# Altium schematic symbol library TTL_74系列.SchLib: 721 symbols (part 1 of 7) (continued)
## 74F182
designator U?
Look-Ahead Carry Generator
footprint DIP-16
simulation model 74F182 (SIMCODE)
pins: 1 ~{G}1 (in), 2 ~{P}1 (in), 3 ~{G}0 (in), 4 ~{P}0 (in), 5 ~{G}3 (in), 6 ~{P}3 (in), 7 ~{P} (out), 8 GND (power) hidden to GND, 9 Cn+z (out), 10 ~{G} (out), 11 Cn+y (out), 12 Cn+x (out), 13 Cn (in), 14 ~{G}2 (in), 15 ~{P}2 (in), 16 VCC (power) hidden to VCC
1 alternate drawing of the same symbol

## 74F190
designator U?
Synchronous 4-Bit Up/Down Decade Counter with Down/Up Mode Control
footprint DIP-16
simulation model 74F190 (SIMCODE)
pins: 1 B (in), 2 QB (out), 3 QA (out), 4 ~{CTEN} (in), 5 D/~{U} (in), 6 QC (out), 7 QD (out), 8 GND (power) hidden to GND, 9 D (in), 10 C (in), 11 ~{LD} (in), 12 MAX/MIN (out), 13 ~{RCO} (out), 14 CLK (in), 15 A (in), 16 VCC (power) hidden to VCC
1 alternate drawing of the same symbol

## 74F191
designator U?
Synchronous 4-Bit Up/Down Binary Counter with Down/Up Mode Control
footprint DIP-16
simulation model 74F191 (SIMCODE)
pins: 1 B (in), 2 QB (out), 3 QA (out), 4 ~{CTEN} (in), 5 D/~{U} (in), 6 QC (out), 7 QD (out), 8 GND (power) hidden to GND, 9 D (in), 10 C (in), 11 ~{LD} (in), 12 MAX/MIN (out), 13 ~{RCO} (out), 14 CLK (in), 15 A (in), 16 VCC (power) hidden to VCC
1 alternate drawing of the same symbol

## 74F192
designator U?
Synchronous 4-Bit Up/Down Decade Counter (Dual Clock with Clear)
footprint DIP-16
simulation model 74F192 (SIMCODE)
pins: 1 B (in), 2 QB (out), 3 QA (out), 4 DWN (in), 5 UP (in), 6 QC (out), 7 QD (out), 8 GND (power) hidden to GND, 9 D (in), 10 C (in), 11 ~{LD} (in), 12 ~{CO} (out), 13 ~{BO} (out), 14 CLR (in), 15 A (in), 16 VCC (power) hidden to VCC
1 alternate drawing of the same symbol

## 74F193
designator U?
Synchronous 4-Bit Up/Down Binary Counter (Dual Clock with Clear)
footprint DIP-16
simulation model 74F193 (SIMCODE)
pins: 1 B (in), 2 QB (out), 3 QA (out), 4 DWN (in), 5 UP (in), 6 QC (out), 7 QD (out), 8 GND (power) hidden to GND, 9 D (in), 10 C (in), 11 ~{LD} (in), 12 ~{CO} (out), 13 ~{BO} (out), 14 CLR (in), 15 A (in), 16 VCC (power) hidden to VCC
1 alternate drawing of the same symbol

## 74F194
designator U?
4-Bit Bidirectional Universal Shift Register
footprint DIP-16
simulation model 74F194 (SIMCODE)
pins: 1 ~{CLR} (in), 2 SR SER (in), 3 A (in), 4 B (in), 5 C (in), 6 D (in), 7 SL SER (in), 8 GND (power) hidden to GND, 9 S0 (in), 10 S1 (in), 11 CLK (in), 12 QD (out), 13 QC (out), 14 QB (out), 15 QA (out), 16 VCC (power) hidden to VCC
1 alternate drawing of the same symbol

## 74F195
designator U?
4-Bit Parallel-Access Shift Register
footprint DIP-16
simulation model 74F195 (SIMCODE)
pins: 1 ~{CLR} (in), 2 J (in), 3 ~{K} (in), 4 A (in), 5 B (in), 6 C (in), 7 D (in), 8 GND (power) hidden to GND, 9 SH/~{LD} (in), 10 CLK (in), 11 ~{Q}D (out), 12 QD (out), 13 QC (out), 14 QB (out), 15 QA (out), 16 VCC (power) hidden to VCC
1 alternate drawing of the same symbol

## 74F199
designator U?
8-Bit Shift Register
footprint DIP-24
simulation model 74F199 (SIMCODE)
pins: 1 ~{K} (in), 2 J (in), 3 A (in), 4 QA (out), 5 B (in), 6 QB (out), 7 C (in), 8 QC (out), 9 D (in), 10 QD (out), 11 CK INH (in), 12 GND (power) hidden to GND, 13 CLK (in), 14 ~{CLR} (in), 15 QE (out), 16 E (in), 17 QF (out), 18 F (in), 19 QG (out), 20 G (in), 21 QH (out), 22 H (in), 23 SH/~{LD} (in), 24 VCC (power) hidden to VCC
1 alternate drawing of the same symbol

## 74F240
designator U?
Octal Buffer and Line Driver with 3-State Output
footprint DIP-20
simulation model 74F240 (SIMCODE)
pins: 1 1~{G} (in), 2 A1 (in), 3 2Y4 (hiz), 4 A2 (in), 5 2Y3 (hiz), 6 A3 (in), 7 2Y2 (hiz), 8 A4 (in), 9 2Y1 (hiz), 10 GND (power) hidden to GND, 11 B1 (in), 12 1Y4 (hiz), 13 B2 (in), 14 1Y3 (hiz), 15 B3 (in), 16 1Y2 (hiz), 17 B4 (in), 18 1Y1 (hiz), 19 2~{G} (in), 20 VCC (power) hidden to VCC
1 alternate drawing of the same symbol

## 74F241
designator U?
Octal Buffer and Line Driver with 3-State Output
footprint DIP-20
simulation model 74F241 (SIMCODE)
pins: 1 1~{G} (in), 2 A1 (in), 3 2Y4 (hiz), 4 A2 (in), 5 2Y3 (hiz), 6 A3 (in), 7 2Y2 (hiz), 8 A4 (in), 9 2Y1 (hiz), 10 GND (power) hidden to GND, 11 B1 (in), 12 1Y4 (hiz), 13 B2 (in), 14 1Y3 (hiz), 15 B3 (in), 16 1Y2 (hiz), 17 B4 (in), 18 1Y1 (hiz), 19 2~{G} (in), 20 VCC (power) hidden to VCC
1 alternate drawing of the same symbol

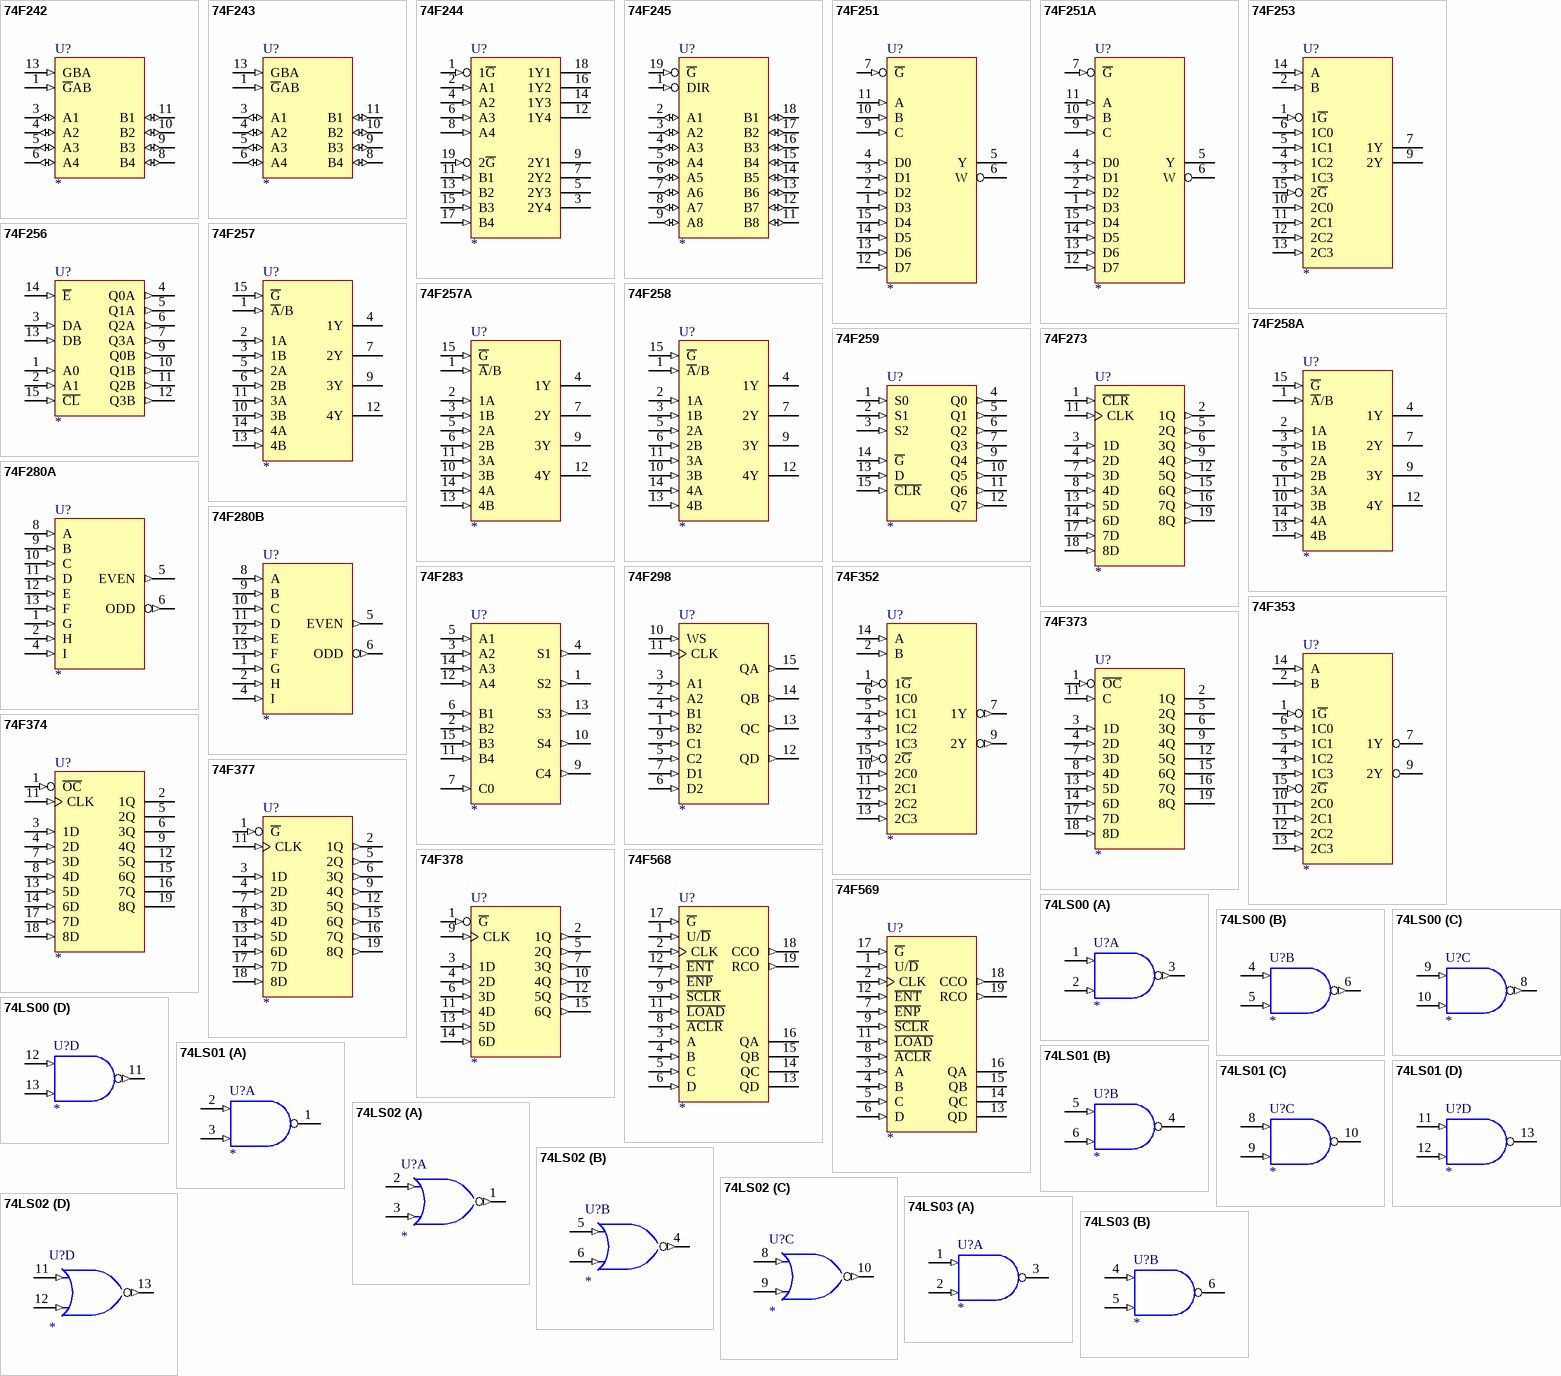
[diagram p3: symbols 74F242 to 74LS03]

## 74F242
designator U?
Quad Bus Transceiver
footprint DIP-14
simulation model 74F242 (SIMCODE)
pins: 1 ~{G}AB (in), 3 A1 (io), 4 A2 (io), 5 A3 (io), 6 A4 (io), 7 GND (power) hidden to GND, 8 B4 (io), 9 B3 (io), 10 B2 (io), 11 B1 (io), 13 GBA (in), 14 VCC (power) hidden to VCC
1 alternate drawing of the same symbol

## 74F243
designator U?
Quad Bus Transceiver
footprint DIP-14
simulation model 74F243 (SIMCODE)
pins: 1 ~{G}AB (in), 3 A1 (io), 4 A2 (io), 5 A3 (io), 6 A4 (io), 7 GND (power) hidden to GND, 8 B4 (io), 9 B3 (io), 10 B2 (io), 11 B1 (io), 13 GBA (in), 14 VCC (power) hidden to VCC
1 alternate drawing of the same symbol

## 74F244
designator U?
Octal Buffer and Line Driver with 3-State Output
footprint DIP-20
simulation model 74F244 (SIMCODE)
pins: 1 1~{G} (in), 2 A1 (in), 3 2Y4 (hiz), 4 A2 (in), 5 2Y3 (hiz), 6 A3 (in), 7 2Y2 (hiz), 8 A4 (in), 9 2Y1 (hiz), 10 GND (power) hidden to GND, 11 B1 (in), 12 1Y4 (hiz), 13 B2 (in), 14 1Y3 (hiz), 15 B3 (in), 16 1Y2 (hiz), 17 B4 (in), 18 1Y1 (hiz), 19 2~{G} (in), 20 VCC (power) hidden to VCC
1 alternate drawing of the same symbol

## 74F245
designator U?
Octal Bus Transceiver with 3-State Output
footprint DIP-20
simulation model 74F245 (SIMCODE)
pins: 1 DIR (in), 2 A1 (io), 3 A2 (io), 4 A3 (io), 5 A4 (io), 6 A5 (io), 7 A6 (io), 8 A7 (io), 9 A8 (io), 10 GND (power) hidden to GND, 11 B8 (io), 12 B7 (io), 13 B6 (io), 14 B5 (io), 15 B4 (io), 16 B3 (io), 17 B2 (io), 18 B1 (io), 19 ~{G} (in), 20 VCC (power) hidden to VCC
1 alternate drawing of the same symbol

## 74F251
designator U?
1-of-8 Data Selectors/Multiplexers with 3-State Output
footprint DIP-16
simulation model 74F251 (SIMCODE)
pins: 1 D3 (in), 2 D2 (in), 3 D1 (in), 4 D0 (in), 5 Y (hiz), 6 W (hiz), 7 ~{G} (in), 8 GND (power) hidden to GND, 9 C (in), 10 B (in), 11 A (in), 12 D7 (in), 13 D6 (in), 14 D5 (in), 15 D4 (in), 16 VCC (power) hidden to VCC
1 alternate drawing of the same symbol

## 74F251A
designator U?
1-of-8 Data Selectors/Multiplexers with 3-State Output
footprint DIP-16
simulation model 74F251A (SIMCODE)
pins: 1 D3 (in), 2 D2 (in), 3 D1 (in), 4 D0 (in), 5 Y (hiz), 6 W (hiz), 7 ~{G} (in), 8 GND (power) hidden to GND, 9 C (in), 10 B (in), 11 A (in), 12 D7 (in), 13 D6 (in), 14 D5 (in), 15 D4 (in), 16 VCC (power) hidden to VCC
1 alternate drawing of the same symbol

## 74F253
designator U?
Dual 4-Line to 1-Line Data Selector/Multiplexer with 3-State Output
footprint DIP-16
simulation model 74F253 (SIMCODE)
pins: 1 1~{G} (in), 2 B (in), 3 1C3 (in), 4 1C2 (in), 5 1C1 (in), 6 1C0 (in), 7 1Y (hiz), 8 GND (power) hidden to GND, 9 2Y (hiz), 10 2C0 (in), 11 2C1 (in), 12 2C2 (in), 13 2C3 (in), 14 A (in), 15 2~{G} (in), 16 VCC (power) hidden to VCC
1 alternate drawing of the same symbol

## 74F256
designator U?
Dual 4-Bit Addressable Latch
footprint DIP-16
simulation model 74F256 (SIMCODE)
pins: 1 A0 (in), 2 A1 (in), 3 DA (in), 4 Q0A (out), 5 Q1A (out), 6 Q2A (out), 7 Q3A (out), 8 GND (power) hidden to GND, 9 Q0B (out), 10 Q1B (out), 11 Q2B (out), 12 Q3B (out), 13 DB (in), 14 ~{E} (in), 15 ~{CL} (in), 16 VCC (power) hidden to VCC

## 74F257
designator U?
Quad 2-Line to 1-Line Data/Selector/Multiplexer with 3-State Output
footprint DIP-16
simulation model 74F257 (SIMCODE)
pins: 1 ~{A}/B (in), 2 1A (in), 3 1B (in), 4 1Y (hiz), 5 2A (in), 6 2B (in), 7 2Y (hiz), 8 GND (power) hidden to GND, 9 3Y (hiz), 10 3B (in), 11 3A (in), 12 4Y (hiz), 13 4B (in), 14 4A (in), 15 ~{G} (in), 16 VCC (power) hidden to VCC
1 alternate drawing of the same symbol

## 74F257A
designator U?
Quad 2-Line to 1-Line Data/Selector/Multiplexer with 3-State Output
footprint DIP-16
simulation model 74F257A (SIMCODE)
pins: 1 ~{A}/B (in), 2 1A (in), 3 1B (in), 4 1Y (hiz), 5 2A (in), 6 2B (in), 7 2Y (hiz), 8 GND (power) hidden to GND, 9 3Y (hiz), 10 3B (in), 11 3A (in), 12 4Y (hiz), 13 4B (in), 14 4A (in), 15 ~{G} (in), 16 VCC (power) hidden to VCC
1 alternate drawing of the same symbol

## 74F258
designator U?
Quad 2-Line to 1-Line Data/Selector/Multiplexer with 3-State Output
footprint DIP-16
simulation model 74F258 (SIMCODE)
pins: 1 ~{A}/B (in), 2 1A (in), 3 1B (in), 4 1Y (hiz), 5 2A (in), 6 2B (in), 7 2Y (hiz), 8 GND (power) hidden to GND, 9 3Y (hiz), 10 3B (in), 11 3A (in), 12 4Y (hiz), 13 4B (in), 14 4A (in), 15 ~{G} (in), 16 VCC (power) hidden to VCC
1 alternate drawing of the same symbol

## 74F258A
designator U?
Quad 2-Line to 1-Line Data/Selector/Multiplexer with 3-State Output
footprint DIP-16
simulation model 74F258A (SIMCODE)
pins: 1 ~{A}/B (in), 2 1A (in), 3 1B (in), 4 1Y (hiz), 5 2A (in), 6 2B (in), 7 2Y (hiz), 8 GND (power) hidden to GND, 9 3Y (hiz), 10 3B (in), 11 3A (in), 12 4Y (hiz), 13 4B (in), 14 4A (in), 15 ~{G} (in), 16 VCC (power) hidden to VCC
1 alternate drawing of the same symbol

## 74F259
designator U?
8-Bit Addressable Latch
footprint DIP-16
simulation model 74F259 (SIMCODE)
pins: 1 S0 (in), 2 S1 (in), 3 S2 (in), 4 Q0 (out), 5 Q1 (out), 6 Q2 (out), 7 Q3 (out), 8 GND (power) hidden to GND, 9 Q4 (out), 10 Q5 (out), 11 Q6 (out), 12 Q7 (out), 13 D (in), 14 ~{G} (in), 15 ~{CLR} (in), 16 VCC (power) hidden to VCC
1 alternate drawing of the same symbol

## 74F273
designator U?
Octal D-Type Flip-Flop with Clear
footprint DIP-20
simulation model 74F273 (SIMCODE)
pins: 1 ~{CLR} (in), 2 1Q (out), 3 1D (in), 4 2D (in), 5 2Q (out), 6 3Q (out), 7 3D (in), 8 4D (in), 9 4Q (out), 10 GND (power) hidden to GND, 11 CLK (in), 12 5Q (out), 13 5D (in), 14 6D (in), 15 6Q (out), 16 7Q (out), 17 7D (in), 18 8D (in), 19 8Q (out), 20 VCC (power) hidden to VCC
1 alternate drawing of the same symbol

## 74F280A
designator U?
9-Bit Odd/Even Parity Generator/Checker
footprint DIP-14
simulation model 74F280A (SIMCODE)
pins: 1 G (in), 2 H (in), 4 I (in), 5 EVEN (out), 6 ODD (out), 7 GND (power) hidden to GND, 8 A (in), 9 B (in), 10 C (in), 11 D (in), 12 E (in), 13 F (in), 14 VCC (power) hidden to VCC
1 alternate drawing of the same symbol

## 74F280B
designator U?
9-Bit Odd/Even Parity Generator/Checker
footprint DIP-14
simulation model 74F280B (SIMCODE)
pins: 1 G (in), 2 H (in), 4 I (in), 5 EVEN (out), 6 ODD (out), 7 GND (power) hidden to GND, 8 A (in), 9 B (in), 10 C (in), 11 D (in), 12 E (in), 13 F (in), 14 VCC (power) hidden to VCC
1 alternate drawing of the same symbol

## 74F283
designator U?
4-Bit Binary Full Adder with Fast Carry
footprint DIP-16
simulation model 74F283 (SIMCODE)
pins: 1 S2 (out), 2 B2 (in), 3 A2 (in), 4 S1 (out), 5 A1 (in), 6 B1 (in), 7 C0 (in), 8 GND (power) hidden to GND, 9 C4 (out), 10 S4 (out), 11 B4 (in), 12 A4 (in), 13 S3 (out), 14 A3 (in), 15 B3 (in), 16 VCC (power) hidden to VCC
1 alternate drawing of the same symbol

## 74F298
designator U?
Quad 2-Input Multiplexer with Storage
footprint DIP-16
simulation model 74F298 (SIMCODE)
pins: 1 B2 (in), 2 A2 (in), 3 A1 (in), 4 B1 (in), 5 C2 (in), 6 D2 (in), 7 D1 (in), 8 GND (power) hidden to GND, 9 C1 (in), 10 WS (in), 11 CLK (in), 12 QD (out), 13 QC (out), 14 QB (out), 15 QA (out), 16 VCC (power) hidden to VCC
1 alternate drawing of the same symbol

## 74F352
designator U?
Dual 4-Line to 1-Line Data Selector/Multiplexer
footprint DIP-16
simulation model 74F352 (SIMCODE)
pins: 1 1~{G} (in), 2 B (in), 3 1C3 (in), 4 1C2 (in), 5 1C1 (in), 6 1C0 (in), 7 1Y (out), 8 GND (power) hidden to GND, 9 2Y (out), 10 2C0 (in), 11 2C1 (in), 12 2C2 (in), 13 2C3 (in), 14 A (in), 15 2~{G} (in), 16 VCC (power) hidden to VCC
1 alternate drawing of the same symbol

## 74F353
designator U?
Dual 4-Line to 1-Line Data Selector/Multiplexer with 3-State Output
footprint DIP-16
simulation model 74F353 (SIMCODE)
pins: 1 1~{G} (in), 2 B (in), 3 1C3 (in), 4 1C2 (in), 5 1C1 (in), 6 1C0 (in), 7 1Y (hiz), 8 GND (power) hidden to GND, 9 2Y (hiz), 10 2C0 (in), 11 2C1 (in), 12 2C2 (in), 13 2C3 (in), 14 A (in), 15 2~{G} (in), 16 VCC (power) hidden to VCC
1 alternate drawing of the same symbol

## 74F373
designator U?
Octal D-Type Transparent Latch with 3-State Output
footprint DIP-20
simulation model 74F373 (SIMCODE)
pins: 1 ~{OC} (in), 2 1Q (hiz), 3 1D (in), 4 2D (in), 5 2Q (hiz), 6 3Q (hiz), 7 3D (in), 8 4D (in), 9 4Q (hiz), 10 GND (power) hidden to GND, 11 C (in), 12 5Q (hiz), 13 5D (in), 14 6D (in), 15 6Q (hiz), 16 7Q (hiz), 17 7D (in), 18 8D (in), 19 8Q (hiz), 20 VCC (power) hidden to VCC
1 alternate drawing of the same symbol

## 74F374
designator U?
Octal D-Type Edge-Triggered Flip-Flop with 3-State Output
footprint DIP-20
simulation model 74F374 (SIMCODE)
pins: 1 ~{OC} (in), 2 1Q (hiz), 3 1D (in), 4 2D (in), 5 2Q (hiz), 6 3Q (hiz), 7 3D (in), 8 4D (in), 9 4Q (hiz), 10 GND (power) hidden to GND, 11 CLK (in), 12 5Q (hiz), 13 5D (in), 14 6D (in), 15 6Q (hiz), 16 7Q (hiz), 17 7D (in), 18 8D (in), 19 8Q (hiz), 20 VCC (power) hidden to VCC
1 alternate drawing of the same symbol

## 74F377
designator U?
Octal D-Type Flip-Flop with Enable
footprint DIP-20
simulation model 74F377 (SIMCODE)
pins: 1 ~{G} (in), 2 1Q (out), 3 1D (in), 4 2D (in), 5 2Q (out), 6 3Q (out), 7 3D (in), 8 4D (in), 9 4Q (out), 10 GND (power) hidden to GND, 11 CLK (in), 12 5Q (out), 13 5D (in), 14 6D (in), 15 6Q (out), 16 7Q (out), 17 7D (in), 18 8D (in), 19 8Q (out), 20 VCC (power) hidden to VCC
1 alternate drawing of the same symbol

## 74F378
designator U?
Hex D-Type Flip Flop with Enable
footprint DIP-16
simulation model 74F378 (SIMCODE)
pins: 1 ~{G} (in), 2 1Q (out), 3 1D (in), 4 2D (in), 5 2Q (out), 6 3D (in), 7 3Q (out), 8 GND (power) hidden to GND, 9 CLK (in), 10 4Q (out), 11 4D (in), 12 5Q (out), 13 5D (in), 14 6D (in), 15 6Q (out), 16 VCC (power) hidden to VCC
1 alternate drawing of the same symbol

## 74F568
designator U?
Synchronous 4-Bit Up/Down Decade Counter with 3-State Outputs
footprint DIP-20
simulation model 74F568 (SIMCODE)
pins: 1 U/~{D} (in), 2 CLK (in), 3 A (in), 4 B (in), 5 C (in), 6 D (in), 7 ~{ENP} (in), 8 ~{ACLR} (in), 9 ~{SCLR} (in), 10 GND (power) hidden to GND, 11 ~{LOAD} (in), 12 ~{ENT} (in), 13 QD (hiz), 14 QC (hiz), 15 QB (hiz), 16 QA (hiz), 17 ~{G} (in), 18 CCO (out), 19 RCO (out), 20 VCC (power) hidden to VCC
1 alternate drawing of the same symbol

## 74F569
designator U?
Synchronous 4-Bit Up/Down Binary Counter with 3-State Outputs
footprint DIP-20
simulation model 74F569 (SIMCODE)
pins: 1 U/~{D} (in), 2 CLK (in), 3 A (in), 4 B (in), 5 C (in), 6 D (in), 7 ~{ENP} (in), 8 ~{ACLR} (in), 9 ~{SCLR} (in), 10 GND (power) hidden to GND, 11 ~{LOAD} (in), 12 ~{ENT} (in), 13 QD (hiz), 14 QC (hiz), 15 QB (hiz), 16 QA (hiz), 17 ~{G} (in), 18 CCO (out), 19 RCO (out), 20 VCC (power) hidden to VCC
1 alternate drawing of the same symbol

## 74LS00
designator U?
Quad 2-Input Positive-NAND Gate
footprint DIP-14
simulation model 74LS00 (SIMCODE)
part A pins: 1 A (in), 2 B (in), 3 Y (out), 7 GND (power) hidden to GND, 14 VCC (power) hidden to VCC
part B pins: 4 A (in), 5 B (in), 6 Y (out), 7 GND (power) hidden to GND, 14 VCC (power) hidden to VCC
part C pins: 7 GND (power) hidden to GND, 8 Y (out), 9 A (in), 10 B (in), 14 VCC (power) hidden to VCC
part D pins: 7 GND (power) hidden to GND, 11 Y (out), 12 A (in), 13 B (in), 14 VCC (power) hidden to VCC
1 alternate drawing of the same symbol

## 74LS01
designator U?
Quad 2-Input Positive-NAND Gate with Open-Collector Output
footprint DIP-14
simulation model 74LS01 (SIMCODE)
part A pins: 1 Y (oc), 2 A (in), 3 B (in), 7 GND (power) hidden to GND, 14 VCC (power) hidden to VCC
part B pins: 4 Y (oc), 5 A (in), 6 B (in), 7 GND (power) hidden to GND, 14 VCC (power) hidden to VCC
part C pins: 7 GND (power) hidden to GND, 8 A (in), 9 B (in), 10 Y (oc), 14 VCC (power) hidden to VCC
part D pins: 7 GND (power) hidden to GND, 11 A (in), 12 B (in), 13 Y (oc), 14 VCC (power) hidden to VCC
1 alternate drawing of the same symbol

## 74LS02
designator U?
Quad 2-Input NOR Gate
footprint DIP-14
simulation model 74LS02 (SIMCODE)
part A pins: 1 Y (out), 2 A (in), 3 B (in), 7 GND (power) hidden to GND, 14 VCC (power) hidden to VCC
part B pins: 4 Y (out), 5 A (in), 6 B (in), 7 GND (power) hidden to GND, 14 VCC (power) hidden to VCC
part C pins: 7 GND (power) hidden to GND, 8 A (in), 9 B (in), 10 Y (out), 14 VCC (power) hidden to VCC
part D pins: 7 GND (power) hidden to GND, 11 A (in), 12 B (in), 13 Y (out), 14 VCC (power) hidden to VCC
1 alternate drawing of the same symbol

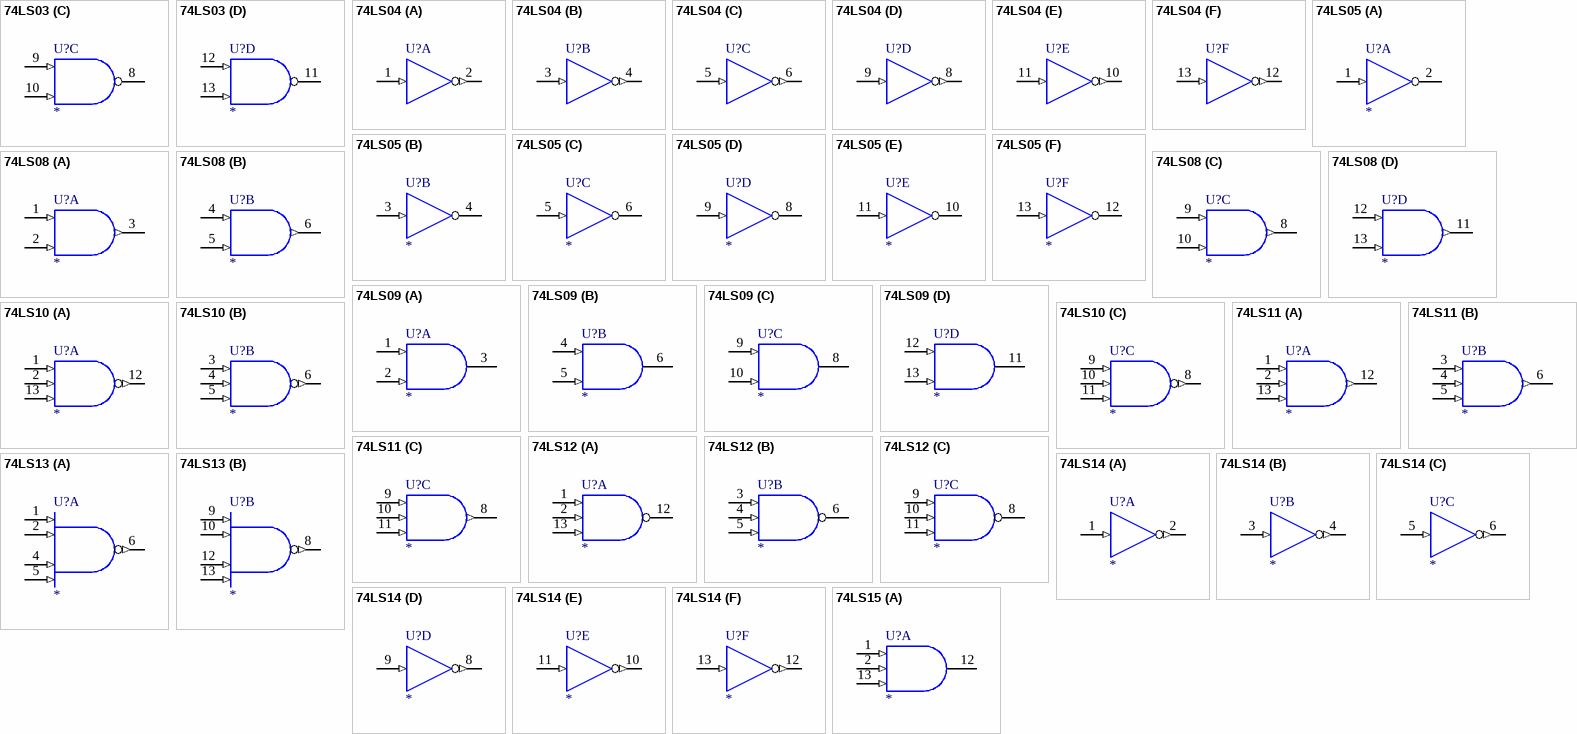
[diagram p4: symbols 74LS03 to 74LS15]

## 74LS03
designator U?
Quad 2-Input Positive-NAND Gate with Open-Collector Output
footprint DIP-14
simulation model 74LS03 (SIMCODE)
part A pins: 1 A (in), 2 B (in), 3 Y (oc), 7 GND (power) hidden to GND, 14 VCC (power) hidden to VCC
part B pins: 4 A (in), 5 B (in), 6 Y (oc), 7 GND (power) hidden to GND, 14 VCC (power) hidden to VCC
part C pins: 7 GND (power) hidden to GND, 8 Y (oc), 9 A (in), 10 B (in), 14 VCC (power) hidden to VCC
part D pins: 7 GND (power) hidden to GND, 11 Y (oc), 12 A (in), 13 B (in), 14 VCC (power) hidden to VCC
1 alternate drawing of the same symbol

## 74LS04
designator U?  (value not drawn)
Hex Inverter
footprint DIP-14
simulation model 74LS04 (SIMCODE)
footprint SOP-14
part A pins: 1 A (in), 2 Y (out), 7 GND (power) hidden to GND, 14 VCC (power) hidden to VCC
part B pins: 3 A (in), 4 Y (out), 7 GND (power) hidden to GND, 14 VCC (power) hidden to VCC
part C pins: 5 A (in), 6 Y (out), 7 GND (power) hidden to GND, 14 VCC (power) hidden to VCC
part D pins: 7 GND (power) hidden to GND, 8 Y (out), 9 A (in), 14 VCC (power) hidden to VCC
part E pins: 7 GND (power) hidden to GND, 10 Y (out), 11 A (in), 14 VCC (power) hidden to VCC
part F pins: 7 GND (power) hidden to GND, 12 Y (out), 13 A (in), 14 VCC (power) hidden to VCC
1 alternate drawing of the same symbol

## 74LS05
designator U?
Hex Inverter with Open-Collector Output
footprint DIP-14
simulation model 74LS05 (SIMCODE)
part A pins: 1 A (in), 2 Y (oc), 7 GND (power) hidden to GND, 14 VCC (power) hidden to VCC
part B pins: 3 A (in), 4 Y (oc), 7 GND (power) hidden to GND, 14 VCC (power) hidden to VCC
part C pins: 5 A (in), 6 Y (oc), 7 GND (power) hidden to GND, 14 VCC (power) hidden to VCC
part D pins: 7 GND (power) hidden to GND, 8 Y (oc), 9 A (in), 14 VCC (power) hidden to VCC
part E pins: 7 GND (power) hidden to GND, 10 Y (oc), 11 A (in), 14 VCC (power) hidden to VCC
part F pins: 7 GND (power) hidden to GND, 12 Y (oc), 13 A (in), 14 VCC (power) hidden to VCC
2 alternate drawings of the same symbol

## 74LS08
designator U?
Quad 2-Input Positive-AND Gate
footprint DIP-14
simulation model 74LS08 (SIMCODE)
part A pins: 1 A (in), 2 B (in), 3 Y (out), 7 GND (power) hidden to GND, 14 VCC (power) hidden to VCC
part B pins: 4 A (in), 5 B (in), 6 Y (out), 7 GND (power) hidden to GND, 14 VCC (power) hidden to VCC
part C pins: 7 GND (power) hidden to GND, 8 Y (out), 9 A (in), 10 B (in), 14 VCC (power) hidden to VCC
part D pins: 7 GND (power) hidden to GND, 11 Y (out), 12 A (in), 13 B (in), 14 VCC (power) hidden to VCC
1 alternate drawing of the same symbol

## 74LS09
designator U?
Quad 2-Input Positive-AND Gate with Open-Collector Output
footprint DIP-14
simulation model 74LS09 (SIMCODE)
part A pins: 1 A (in), 2 B (in), 3 Y (oc), 7 GND (power) hidden to GND, 14 VCC (power) hidden to VCC
part B pins: 4 A (in), 5 B (in), 6 Y (oc), 7 GND (power) hidden to GND, 14 VCC (power) hidden to VCC
part C pins: 7 GND (power) hidden to GND, 8 Y (oc), 9 A (in), 10 B (in), 14 VCC (power) hidden to VCC
part D pins: 7 GND (power) hidden to GND, 11 Y (oc), 12 A (in), 13 B (in), 14 VCC (power) hidden to VCC
1 alternate drawing of the same symbol

## 74LS10
designator U?
Triple 3-Input Positive-NAND Gate
footprint DIP-14
simulation model 74LS10 (SIMCODE)
part A pins: 1 A (in), 2 B (in), 7 GND (power) hidden to GND, 12 Y (out), 13 C (in), 14 VCC (power) hidden to VCC
part B pins: 3 A (in), 4 B (in), 5 C (in), 6 Y (out), 7 GND (power) hidden to GND, 14 VCC (power) hidden to VCC
part C pins: 7 GND (power) hidden to GND, 8 Y (out), 9 A (in), 10 B (in), 11 C (in), 14 VCC (power) hidden to VCC
1 alternate drawing of the same symbol

## 74LS11
designator U?
Triple 3-Input Positive-AND Gate
footprint DIP-14
simulation model 74LS11 (SIMCODE)
part A pins: 1 A (in), 2 B (in), 7 GND (power) hidden to GND, 12 Y (out), 13 C (in), 14 VCC (power) hidden to VCC
part B pins: 3 A (in), 4 B (in), 5 C (in), 6 Y (out), 7 GND (power) hidden to GND, 14 VCC (power) hidden to VCC
part C pins: 7 GND (power) hidden to GND, 8 Y (out), 9 A (in), 10 B (in), 11 C (in), 14 VCC (power) hidden to VCC
1 alternate drawing of the same symbol

## 74LS12
designator U?
Triple 3-Input Positive-NAND Gate with Open-Collector Output
footprint DIP-14
simulation model 74LS12 (SIMCODE)
part A pins: 1 A (in), 2 B (in), 7 GND (power) hidden to GND, 12 Y (oc), 13 C (in), 14 VCC (power) hidden to VCC
part B pins: 3 A (in), 4 B (in), 5 C (in), 6 Y (oc), 7 GND (power) hidden to GND, 14 VCC (power) hidden to VCC
part C pins: 7 GND (power) hidden to GND, 8 Y (oc), 9 A (in), 10 B (in), 11 C (in), 14 VCC (power) hidden to VCC
1 alternate drawing of the same symbol

## 74LS13
designator U?
Dual 4-Input Positive-NAND Schmitt-Trigger
footprint DIP-14
simulation model 74LS13 (SIMCODE)
part A pins: 1 A (in), 2 B (in), 4 C (in), 5 D (in), 6 Y (out), 7 GND (power) hidden to GND, 14 VCC (power) hidden to VCC
part B pins: 7 GND (power) hidden to GND, 8 Y (out), 9 A (in), 10 B (in), 12 C (in), 13 D (in), 14 VCC (power) hidden to VCC
1 alternate drawing of the same symbol

## 74LS14
designator U?
Hex Schmitt-Trigger Inverter
footprint DIP-14
simulation model 74LS14 (SIMCODE)
part A pins: 1 A (in), 2 Y (out), 7 GND (power) hidden to GND, 14 VCC (power) hidden to VCC
part B pins: 3 A (in), 4 Y (out), 7 GND (power) hidden to GND, 14 VCC (power) hidden to VCC
part C pins: 5 A (in), 6 Y (out), 7 GND (power) hidden to GND, 14 VCC (power) hidden to VCC
part D pins: 7 GND (power) hidden to GND, 8 Y (out), 9 A (in), 14 VCC (power) hidden to VCC
part E pins: 7 GND (power) hidden to GND, 10 Y (out), 11 A (in), 14 VCC (power) hidden to VCC
part F pins: 7 GND (power) hidden to GND, 12 Y (out), 13 A (in), 14 VCC (power) hidden to VCC
1 alternate drawing of the same symbol

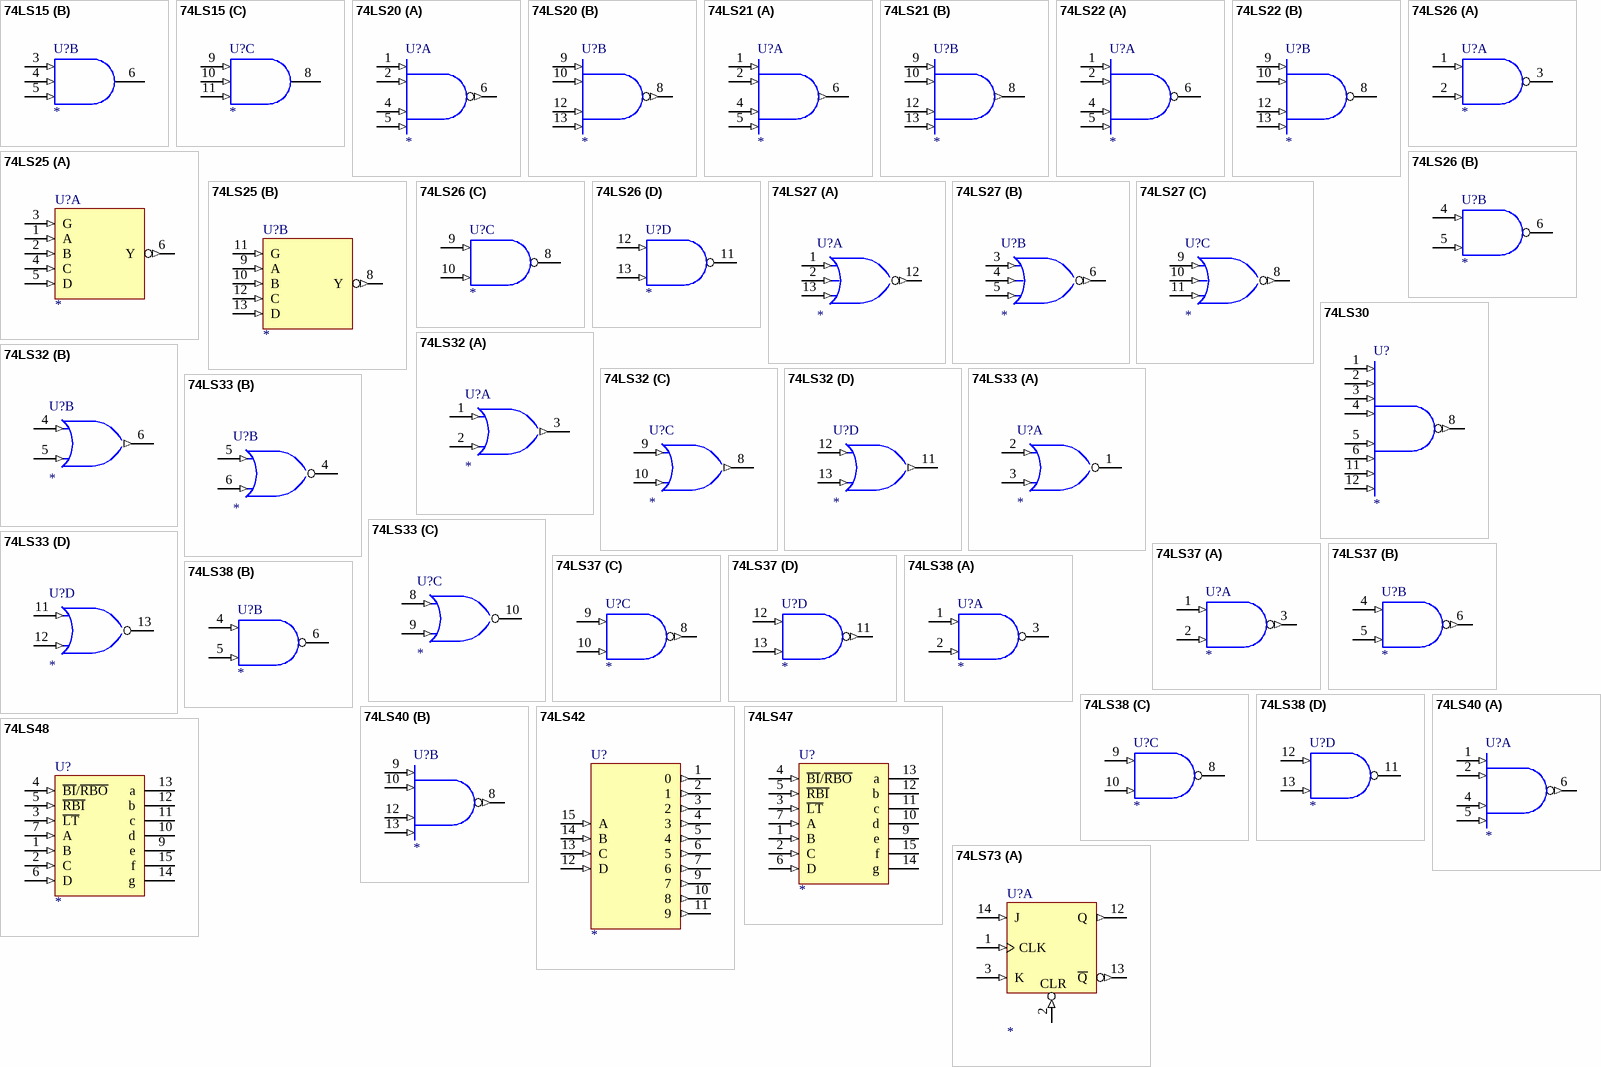
[diagram p5: symbols 74LS15 to 74LS73]

## 74LS15
designator U?
Triple 3-Input Positive-AND Gate with Open-Collector Output
footprint DIP-14
simulation model 74LS15 (SIMCODE)
part A pins: 1 A (in), 2 B (in), 7 GND (power) hidden to GND, 12 Y (oc), 13 C (in), 14 VCC (power) hidden to VCC
part B pins: 3 A (in), 4 B (in), 5 C (in), 6 Y (oc), 7 GND (power) hidden to GND, 14 VCC (power) hidden to VCC
part C pins: 7 GND (power) hidden to GND, 8 Y (oc), 9 A (in), 10 B (in), 11 C (in), 14 VCC (power) hidden to VCC
1 alternate drawing of the same symbol

## 74LS20
designator U?
Dual 4-Input Positive-NAND Gate
footprint DIP-14
simulation model 74LS20 (SIMCODE)
part A pins: 1 A (in), 2 B (in), 4 C (in), 5 D (in), 6 Y (out), 7 GND (power) hidden to GND, 14 VCC (power) hidden to VCC
part B pins: 7 GND (power) hidden to GND, 8 Y (out), 9 A (in), 10 B (in), 12 C (in), 13 D (in), 14 VCC (power) hidden to VCC
2 alternate drawings of the same symbol

## 74LS21
designator U?
Dual 4-Input Positive-AND Gate
footprint DIP-14
simulation model 74LS21 (SIMCODE)
part A pins: 1 A (in), 2 B (in), 4 C (in), 5 D (in), 6 Y (out), 7 GND (power) hidden to GND, 14 VCC (power) hidden to VCC
part B pins: 7 GND (power) hidden to GND, 8 Y (out), 9 A (in), 10 B (in), 12 C (in), 13 D (in), 14 VCC (power) hidden to VCC
2 alternate drawings of the same symbol

## 74LS22
designator U?
Dual 4-Input Positive-NAND Gate with Open-Collector Outputs
footprint DIP-14
simulation model 74LS22 (SIMCODE)
part A pins: 1 A (in), 2 B (in), 4 C (in), 5 D (in), 6 Y (oc), 7 GND (power) hidden to GND, 14 VCC (power) hidden to VCC
part B pins: 7 GND (power) hidden to GND, 8 Y (oc), 9 A (in), 10 B (in), 12 C (in), 13 D (in), 14 VCC (power) hidden to VCC
2 alternate drawings of the same symbol

## 74LS25
designator U?
Dual 4-Input NOR Gate with Strobe
footprint DIP-14
simulation model 74LS25 (SIMCODE)
part A pins: 1 A (in), 2 B (in), 3 G (in), 4 C (in), 5 D (in), 6 Y (out), 7 GND (power) hidden to GND, 14 VCC (power) hidden to VCC
part B pins: 7 GND (power) hidden to GND, 8 Y (out), 9 A (in), 10 B (in), 11 G (in), 12 C (in), 13 D (in), 14 VCC (power) hidden to VCC
1 alternate drawing of the same symbol

## 74LS26
designator U?
High-Voltage Interface Positive-NAND Gate
footprint DIP-14
simulation model 74LS26 (SIMCODE)
part A pins: 1 A (in), 2 B (in), 3 Y (oc), 7 GND (power) hidden to GND, 14 VCC (power) hidden to VCC
part B pins: 4 A (in), 5 B (in), 6 Y (oc), 7 GND (power) hidden to GND, 14 VCC (power) hidden to VCC
part C pins: 7 GND (power) hidden to GND, 8 Y (oc), 9 A (in), 10 B (in), 14 VCC (power) hidden to VCC
part D pins: 7 GND (power) hidden to GND, 11 Y (oc), 12 A (in), 13 B (in), 14 VCC (power) hidden to VCC
1 alternate drawing of the same symbol

## 74LS27
designator U?
Triple 3-Input Positive-NOR Gate
footprint DIP-14
simulation model 74LS27 (SIMCODE)
part A pins: 1 A (in), 2 B (in), 7 GND (power) hidden to GND, 12 Y (out), 13 C (in), 14 VCC (power) hidden to VCC
part B pins: 3 A (in), 4 B (in), 5 C (in), 6 Y (out), 7 GND (power) hidden to GND, 14 VCC (power) hidden to VCC
part C pins: 7 GND (power) hidden to GND, 8 Y (out), 9 A (in), 10 B (in), 11 C (in), 14 VCC (power) hidden to VCC
1 alternate drawing of the same symbol